# Altium integrated library WCAP-AIG8_rev15a.intlib: 27 symbols
Pins are listed as number, name and electrical type; pins without a type are passive.

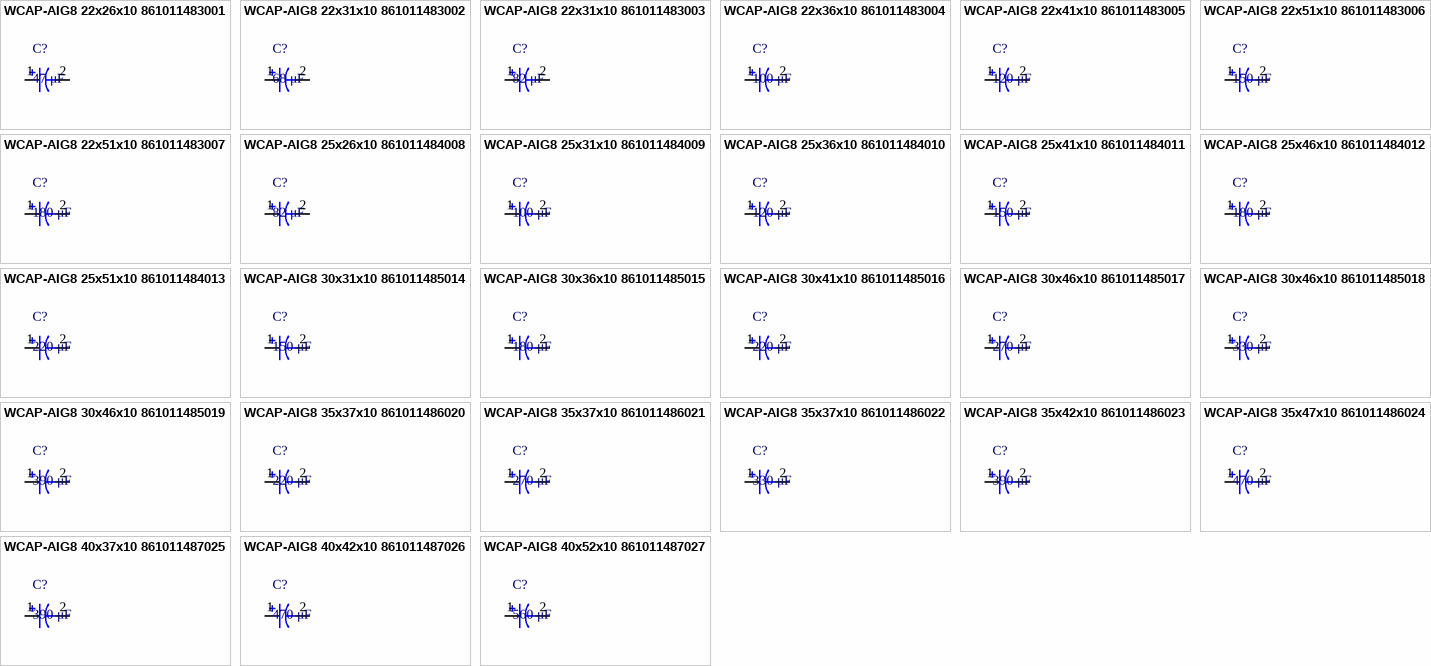
[diagram p0: symbols WCAP-AIG8 22x26x10 861011483001 to WCAP-AIG8 40x52x10 861011487027]

## WCAP-AIG8 22x26x10 861011483001
designator C?, comment 47 μF
WCAP-AIG8 Aluminum Electrolytic Capacitors , 47 μF; + / - 20%; 450 V , 22 x 26; Manufacturer: Wurth Elektronik; partNo: 861011483001; E-mail: libraries@we-online.com; Characteristics: Aluminum Electrolytic Capacitor; Recommended soldering: Wave; Operating temperature: –25 °C to +85 °C; General purpose product series; Load life: 2000 h @ +85 °C; ComponentLink1Description: Manufacturer; ComponentLink1URL: http://www.we-online.com; ComponentLink2Description: Datasheet; ComponentLink2URL: http://katalog.we-online.de/pbs/datasheet/861011483001.pdf; Created by: Karrer Zheng; Created Date: 6/8/2015; Capacitance: 47 μF; Application: Medium and high voltage type range from 160V-450V used as primary side input filter in power supply, which can be used in general switching power supply, PC power supply and industrial computer power supply,server power supply, AC-DC converter, motor drive circuit DC storage filter, digital audio, digital TV, communication base station, DC-AC inverter, inverter power supply and converters etc
footprint WCAP-AIG8 22x26x10
pins: 1, 2

## WCAP-AIG8 22x31x10 861011483002
designator C?, comment 68 μF
WCAP-AIG8 Aluminum Electrolytic Capacitors , 68 μF; + / - 20%; 450 V , 22 x 31; Manufacturer: Wurth Elektronik; partNo: 861011483002; E-mail: libraries@we-online.com; Characteristics: Aluminum Electrolytic Capacitor; Recommended soldering: Wave; Operating temperature: –25 °C to +85 °C; General purpose product series; Load life: 2000 h @ +85 °C; ComponentLink1Description: Manufacturer; ComponentLink1URL: http://www.we-online.com; ComponentLink2Description: Datasheet; ComponentLink2URL: http://katalog.we-online.de/pbs/datasheet/861011483002.pdf; Created by: Karrer Zheng; Created Date: 6/8/2015; Capacitance: 68 μF; Application: Medium and high voltage type range from 160V-450V used as primary side input filter in power supply, which can be used in general switching power supply, PC power supply and industrial computer power supply,server power supply, AC-DC converter, motor drive circuit DC storage filter, digital audio, digital TV, communication base station, DC-AC inverter, inverter power supply and converters etc
footprint WCAP-AIG8 22x31x10
pins: 1, 2

## WCAP-AIG8 22x31x10 861011483003
designator C?, comment 82 μF
WCAP-AIG8 Aluminum Electrolytic Capacitors , 82 μF; + / - 20%; 450 V , 22 x 31; Manufacturer: Wurth Elektronik; partNo: 861011483003; E-mail: libraries@we-online.com; Characteristics: Aluminum Electrolytic Capacitor; Recommended soldering: Wave; Operating temperature: –25 °C to +85 °C; General purpose product series; Load life: 2000 h @ +85 °C; ComponentLink1Description: Manufacturer; ComponentLink1URL: http://www.we-online.com; ComponentLink2Description: Datasheet; ComponentLink2URL: http://katalog.we-online.de/pbs/datasheet/861011483003.pdf; Created by: Karrer Zheng; Created Date: 6/8/2015; Capacitance: 82 μF; Application: Medium and high voltage type range from 160V-450V used as primary side input filter in power supply, which can be used in general switching power supply, PC power supply and industrial computer power supply,server power supply, AC-DC converter, motor drive circuit DC storage filter, digital audio, digital TV, communication base station, DC-AC inverter, inverter power supply and converters etc
footprint WCAP-AIG8 22x31x10
pins: 1, 2

## WCAP-AIG8 22x36x10 861011483004
designator C?, comment 100 μF
WCAP-AIG8 Aluminum Electrolytic Capacitors , 100 μF; + / - 20%; 450 V , 22 x 36; Manufacturer: Wurth Elektronik; partNo: 861011483004; E-mail: libraries@we-online.com; Characteristics: Aluminum Electrolytic Capacitor; Recommended soldering: Wave; Operating temperature: –25 °C to +85 °C; General purpose product series; Load life: 2000 h @ +85 °C; ComponentLink1Description: Manufacturer; ComponentLink1URL: http://www.we-online.com; ComponentLink2Description: Datasheet; ComponentLink2URL: http://katalog.we-online.de/pbs/datasheet/861011483004.pdf; Created by: Karrer Zheng; Created Date: 6/8/2015; Capacitance: 100 μF; Application: Medium and high voltage type range from 160V-450V used as primary side input filter in power supply, which can be used in general switching power supply, PC power supply and industrial computer power supply,server power supply, AC-DC converter, motor drive circuit DC storage filter, digital audio, digital TV, communication base station, DC-AC inverter, inverter power supply and converters etc
footprint WCAP-AIG8 22x36x10
pins: 1, 2

## WCAP-AIG8 22x41x10 861011483005
designator C?, comment 120 μF
WCAP-AIG8 Aluminum Electrolytic Capacitors , 120 μF; + / - 20%; 450 V , 22 x 41; Manufacturer: Wurth Elektronik; partNo: 861011483005; E-mail: libraries@we-online.com; Characteristics: Aluminum Electrolytic Capacitor; Recommended soldering: Wave; Operating temperature: –25 °C to +85 °C; General purpose product series; Load life: 2000 h @ +85 °C; ComponentLink1Description: Manufacturer; ComponentLink1URL: http://www.we-online.com; ComponentLink2Description: Datasheet; ComponentLink2URL: http://katalog.we-online.de/pbs/datasheet/861011483005.pdf; Created by: Karrer Zheng; Created Date: 6/8/2015; Capacitance: 120 μF; Application: Medium and high voltage type range from 160V-450V used as primary side input filter in power supply, which can be used in general switching power supply, PC power supply and industrial computer power supply,server power supply, AC-DC converter, motor drive circuit DC storage filter, digital audio, digital TV, communication base station, DC-AC inverter, inverter power supply and converters etc
footprint WCAP-AIG8 22x41x10
pins: 1, 2

## WCAP-AIG8 22x51x10 861011483006
designator C?, comment 150 μF
WCAP-AIG8 Aluminum Electrolytic Capacitors , 150 μF; + / - 20%; 450 V , 22 x 51; Manufacturer: Wurth Elektronik; partNo: 861011483006; E-mail: libraries@we-online.com; Characteristics: Aluminum Electrolytic Capacitor; Recommended soldering: Wave; Operating temperature: –25 °C to +85 °C; General purpose product series; Load life: 2000 h @ +85 °C; ComponentLink1Description: Manufacturer; ComponentLink1URL: http://www.we-online.com; ComponentLink2Description: Datasheet; ComponentLink2URL: http://katalog.we-online.de/pbs/datasheet/861011483006.pdf; Created by: Karrer Zheng; Created Date: 6/8/2015; Capacitance: 150 μF; Application: Medium and high voltage type range from 160V-450V used as primary side input filter in power supply, which can be used in general switching power supply, PC power supply and industrial computer power supply,server power supply, AC-DC converter, motor drive circuit DC storage filter, digital audio, digital TV, communication base station, DC-AC inverter, inverter power supply and converters etc
footprint WCAP-AIG8 22x51x10
pins: 1, 2

## WCAP-AIG8 22x51x10 861011483007
designator C?, comment 180 μF
WCAP-AIG8 Aluminum Electrolytic Capacitors , 180 μF; + / - 20%; 450 V , 22 x 51; Manufacturer: Wurth Elektronik; partNo: 861011483007; E-mail: libraries@we-online.com; Characteristics: Aluminum Electrolytic Capacitor; Recommended soldering: Wave; Operating temperature: –25 °C to +85 °C; General purpose product series; Load life: 2000 h @ +85 °C; ComponentLink1Description: Manufacturer; ComponentLink1URL: http://www.we-online.com; ComponentLink2Description: Datasheet; ComponentLink2URL: http://katalog.we-online.de/pbs/datasheet/861011483007.pdf; Created by: Karrer Zheng; Created Date: 6/8/2015; Capacitance: 180 μF; Application: Medium and high voltage type range from 160V-450V used as primary side input filter in power supply, which can be used in general switching power supply, PC power supply and industrial computer power supply,server power supply, AC-DC converter, motor drive circuit DC storage filter, digital audio, digital TV, communication base station, DC-AC inverter, inverter power supply and converters etc
footprint WCAP-AIG8 22x51x10
pins: 1, 2

## WCAP-AIG8 25x26x10 861011484008
designator C?, comment 82 μF
WCAP-AIG8 Aluminum Electrolytic Capacitors , 82 μF; + / - 20%; 450 V , 25 x 26; Manufacturer: Wurth Elektronik; partNo: 861011484008; E-mail: libraries@we-online.com; Characteristics: Aluminum Electrolytic Capacitor; Recommended soldering: Wave; Operating temperature: –25 °C to +85 °C; General purpose product series; Load life: 2000 h @ +85 °C; ComponentLink1Description: Manufacturer; ComponentLink1URL: http://www.we-online.com; ComponentLink2Description: Datasheet; ComponentLink2URL: http://katalog.we-online.de/pbs/datasheet/861011484008.pdf; Created by: Karrer Zheng; Created Date: 6/8/2015; Capacitance: 82 μF; Application: Medium and high voltage type range from 160V-450V used as primary side input filter in power supply, which can be used in general switching power supply, PC power supply and industrial computer power supply,server power supply, AC-DC converter, motor drive circuit DC storage filter, digital audio, digital TV, communication base station, DC-AC inverter, inverter power supply and converters etc
footprint WCAP-AIG8 25x26x10
pins: 1, 2

## WCAP-AIG8 25x31x10 861011484009
designator C?, comment 100 μF
WCAP-AIG8 Aluminum Electrolytic Capacitors , 100 μF; + / - 20%; 450 V , 25 x 31; Manufacturer: Wurth Elektronik; partNo: 861011484009; E-mail: libraries@we-online.com; Characteristics: Aluminum Electrolytic Capacitor; Recommended soldering: Wave; Operating temperature: –25 °C to +85 °C; General purpose product series; Load life: 2000 h @ +85 °C; ComponentLink1Description: Manufacturer; ComponentLink1URL: http://www.we-online.com; ComponentLink2Description: Datasheet; ComponentLink2URL: http://katalog.we-online.de/pbs/datasheet/861011484009.pdf; Created by: Karrer Zheng; Created Date: 6/8/2015; Capacitance: 100 μF; Application: Medium and high voltage type range from 160V-450V used as primary side input filter in power supply, which can be used in general switching power supply, PC power supply and industrial computer power supply,server power supply, AC-DC converter, motor drive circuit DC storage filter, digital audio, digital TV, communication base station, DC-AC inverter, inverter power supply and converters etc
footprint WCAP-AIG8 25x31x10
pins: 1, 2

## WCAP-AIG8 25x36x10 861011484010
designator C?, comment 120 μF
WCAP-AIG8 Aluminum Electrolytic Capacitors , 120 μF; + / - 20%; 450 V , 25 x 36; Manufacturer: Wurth Elektronik; partNo: 861011484010; E-mail: libraries@we-online.com; Characteristics: Aluminum Electrolytic Capacitor; Recommended soldering: Wave; Operating temperature: –25 °C to +85 °C; General purpose product series; Load life: 2000 h @ +85 °C; ComponentLink1Description: Manufacturer; ComponentLink1URL: http://www.we-online.com; ComponentLink2Description: Datasheet; ComponentLink2URL: http://katalog.we-online.de/pbs/datasheet/861011484010.pdf; Created by: Karrer Zheng; Created Date: 6/8/2015; Capacitance: 120 μF; Application: Medium and high voltage type range from 160V-450V used as primary side input filter in power supply, which can be used in general switching power supply, PC power supply and industrial computer power supply,server power supply, AC-DC converter, motor drive circuit DC storage filter, digital audio, digital TV, communication base station, DC-AC inverter, inverter power supply and converters etc
footprint WCAP-AIG8 25x36x10
pins: 1, 2

## WCAP-AIG8 25x41x10 861011484011
designator C?, comment 150 μF
WCAP-AIG8 Aluminum Electrolytic Capacitors , 150 μF; + / - 20%; 450 V , 25 x 41; Manufacturer: Wurth Elektronik; partNo: 861011484011; E-mail: libraries@we-online.com; Characteristics: Aluminum Electrolytic Capacitor; Recommended soldering: Wave; Operating temperature: –25 °C to +85 °C; General purpose product series; Load life: 2000 h @ +85 °C; ComponentLink1Description: Manufacturer; ComponentLink1URL: http://www.we-online.com; ComponentLink2Description: Datasheet; ComponentLink2URL: http://katalog.we-online.de/pbs/datasheet/861011484011.pdf; Created by: Karrer Zheng; Created Date: 6/8/2015; Capacitance: 150 μF; Application: Medium and high voltage type range from 160V-450V used as primary side input filter in power supply, which can be used in general switching power supply, PC power supply and industrial computer power supply,server power supply, AC-DC converter, motor drive circuit DC storage filter, digital audio, digital TV, communication base station, DC-AC inverter, inverter power supply and converters etc
footprint WCAP-AIG8 25x41x10
pins: 1, 2

## WCAP-AIG8 25x46x10 861011484012
designator C?, comment 180 μF
WCAP-AIG8 Aluminum Electrolytic Capacitors , 180 μF; + / - 20%; 450 V , 25 x 46; Manufacturer: Wurth Elektronik; partNo: 861011484012; E-mail: libraries@we-online.com; Characteristics: Aluminum Electrolytic Capacitor; Recommended soldering: Wave; Operating temperature: –25 °C to +85 °C; General purpose product series; Load life: 2000 h @ +85 °C; ComponentLink1Description: Manufacturer; ComponentLink1URL: http://www.we-online.com; ComponentLink2Description: Datasheet; ComponentLink2URL: http://katalog.we-online.de/pbs/datasheet/861011484012.pdf; Created by: Karrer Zheng; Created Date: 6/8/2015; Capacitance: 180 μF; Application: Medium and high voltage type range from 160V-450V used as primary side input filter in power supply, which can be used in general switching power supply, PC power supply and industrial computer power supply,server power supply, AC-DC converter, motor drive circuit DC storage filter, digital audio, digital TV, communication base station, DC-AC inverter, inverter power supply and converters etc
footprint WCAP-AIG8 25x46x10
pins: 1, 2

## WCAP-AIG8 25x51x10 861011484013
designator C?, comment 220 μF
WCAP-AIG8 Aluminum Electrolytic Capacitors , 220 μF; + / - 20%; 450 V , 25 x 51; Manufacturer: Wurth Elektronik; partNo: 861011484013; E-mail: libraries@we-online.com; Characteristics: Aluminum Electrolytic Capacitor; Recommended soldering: Wave; Operating temperature: –25 °C to +85 °C; General purpose product series; Load life: 2000 h @ +85 °C; ComponentLink1Description: Manufacturer; ComponentLink1URL: http://www.we-online.com; ComponentLink2Description: Datasheet; ComponentLink2URL: http://katalog.we-online.de/pbs/datasheet/861011484013.pdf; Created by: Karrer Zheng; Created Date: 6/8/2015; Capacitance: 220 μF; Application: Medium and high voltage type range from 160V-450V used as primary side input filter in power supply, which can be used in general switching power supply, PC power supply and industrial computer power supply,server power supply, AC-DC converter, motor drive circuit DC storage filter, digital audio, digital TV, communication base station, DC-AC inverter, inverter power supply and converters etc
footprint WCAP-AIG8 25x51x10
pins: 1, 2

## WCAP-AIG8 30x31x10 861011485014
designator C?, comment 150 μF
WCAP-AIG8 Aluminum Electrolytic Capacitors , 150 μF; + / - 20%; 450 V , 30 x 31; Manufacturer: Wurth Elektronik; partNo: 861011485014; E-mail: libraries@we-online.com; Characteristics: Aluminum Electrolytic Capacitor; Recommended soldering: Wave; Operating temperature: –25 °C to +85 °C; General purpose product series; Load life: 2000 h @ +85 °C; ComponentLink1Description: Manufacturer; ComponentLink1URL: http://www.we-online.com; ComponentLink2Description: Datasheet; ComponentLink2URL: http://katalog.we-online.de/pbs/datasheet/861011485014.pdf; Created by: Karrer Zheng; Created Date: 6/8/2015; Capacitance: 150 μF; Application: Medium and high voltage type range from 160V-450V used as primary side input filter in power supply, which can be used in general switching power supply, PC power supply and industrial computer power supply,server power supply, AC-DC converter, motor drive circuit DC storage filter, digital audio, digital TV, communication base station, DC-AC inverter, inverter power supply and converters etc
footprint WCAP-AIG8 30x31x10
pins: 1, 2

## WCAP-AIG8 30x36x10 861011485015
designator C?, comment 180 μF
WCAP-AIG8 Aluminum Electrolytic Capacitors , 180 μF; + / - 20%; 450 V , 30 x 36; Manufacturer: Wurth Elektronik; partNo: 861011485015; E-mail: libraries@we-online.com; Characteristics: Aluminum Electrolytic Capacitor; Recommended soldering: Wave; Operating temperature: –25 °C to +85 °C; General purpose product series; Load life: 2000 h @ +85 °C; ComponentLink1Description: Manufacturer; ComponentLink1URL: http://www.we-online.com; ComponentLink2Description: Datasheet; ComponentLink2URL: http://katalog.we-online.de/pbs/datasheet/861011485015.pdf; Created by: Karrer Zheng; Created Date: 6/8/2015; Capacitance: 180 μF; Application: Medium and high voltage type range from 160V-450V used as primary side input filter in power supply, which can be used in general switching power supply, PC power supply and industrial computer power supply,server power supply, AC-DC converter, motor drive circuit DC storage filter, digital audio, digital TV, communication base station, DC-AC inverter, inverter power supply and converters etc
footprint WCAP-AIG8 30x36x10
pins: 1, 2

## WCAP-AIG8 30x41x10 861011485016
designator C?, comment 220 μF
WCAP-AIG8 Aluminum Electrolytic Capacitors , 220 μF; + / - 20%; 450 V , 30 x 41; Manufacturer: Wurth Elektronik; partNo: 861011485016; E-mail: libraries@we-online.com; Characteristics: Aluminum Electrolytic Capacitor; Recommended soldering: Wave; Operating temperature: –25 °C to +85 °C; General purpose product series; Load life: 2000 h @ +85 °C; ComponentLink1Description: Manufacturer; ComponentLink1URL: http://www.we-online.com; ComponentLink2Description: Datasheet; ComponentLink2URL: http://katalog.we-online.de/pbs/datasheet/861011485016.pdf; Created by: Karrer Zheng; Created Date: 6/8/2015; Capacitance: 220 μF; Application: Medium and high voltage type range from 160V-450V used as primary side input filter in power supply, which can be used in general switching power supply, PC power supply and industrial computer power supply,server power supply, AC-DC converter, motor drive circuit DC storage filter, digital audio, digital TV, communication base station, DC-AC inverter, inverter power supply and converters etc
footprint WCAP-AIG8 30x41x10
pins: 1, 2

## WCAP-AIG8 30x46x10 861011485017
designator C?, comment 270 μF
WCAP-AIG8 Aluminum Electrolytic Capacitors , 270 μF; + / - 20%; 450 V , 30 x 46; Manufacturer: Wurth Elektronik; partNo: 861011485017; E-mail: libraries@we-online.com; Characteristics: Aluminum Electrolytic Capacitor; Recommended soldering: Wave; Operating temperature: –25 °C to +85 °C; General purpose product series; Load life: 2000 h @ +85 °C; ComponentLink1Description: Manufacturer; ComponentLink1URL: http://www.we-online.com; ComponentLink2Description: Datasheet; ComponentLink2URL: http://katalog.we-online.de/pbs/datasheet/861011485017.pdf; Created by: Karrer Zheng; Created Date: 6/8/2015; Capacitance: 270 μF; Application: Medium and high voltage type range from 160V-450V used as primary side input filter in power supply, which can be used in general switching power supply, PC power supply and industrial computer power supply,server power supply, AC-DC converter, motor drive circuit DC storage filter, digital audio, digital TV, communication base station, DC-AC inverter, inverter power supply and converters etc
footprint WCAP-AIG8 30x46x10
pins: 1, 2

## WCAP-AIG8 30x46x10 861011485018
designator C?, comment 330 μF
WCAP-AIG8 Aluminum Electrolytic Capacitors , 330 μF; + / - 20%; 450 V , 30 x 46; Manufacturer: Wurth Elektronik; partNo: 861011485018; E-mail: libraries@we-online.com; Characteristics: Aluminum Electrolytic Capacitor; Recommended soldering: Wave; Operating temperature: –25 °C to +85 °C; General purpose product series; Load life: 2000 h @ +85 °C; ComponentLink1Description: Manufacturer; ComponentLink1URL: http://www.we-online.com; ComponentLink2Description: Datasheet; ComponentLink2URL: http://katalog.we-online.de/pbs/datasheet/861011485018.pdf; Created by: Karrer Zheng; Created Date: 6/8/2015; Capacitance: 330 μF; Application: Medium and high voltage type range from 160V-450V used as primary side input filter in power supply, which can be used in general switching power supply, PC power supply and industrial computer power supply,server power supply, AC-DC converter, motor drive circuit DC storage filter, digital audio, digital TV, communication base station, DC-AC inverter, inverter power supply and converters etc
footprint WCAP-AIG8 30x46x10
pins: 1, 2

## WCAP-AIG8 30x46x10 861011485019
designator C?, comment 390 μF
WCAP-AIG8 Aluminum Electrolytic Capacitors , 390 μF; + / - 20%; 450 V , 30 x 46; Manufacturer: Wurth Elektronik; partNo: 861011485019; E-mail: libraries@we-online.com; Characteristics: Aluminum Electrolytic Capacitor; Recommended soldering: Wave; Operating temperature: –25 °C to +85 °C; General purpose product series; Load life: 2000 h @ +85 °C; ComponentLink1Description: Manufacturer; ComponentLink1URL: http://www.we-online.com; ComponentLink2Description: Datasheet; ComponentLink2URL: http://katalog.we-online.de/pbs/datasheet/861011485019.pdf; Created by: Karrer Zheng; Created Date: 6/8/2015; Capacitance: 390 μF; Application: Medium and high voltage type range from 160V-450V used as primary side input filter in power supply, which can be used in general switching power supply, PC power supply and industrial computer power supply,server power supply, AC-DC converter, motor drive circuit DC storage filter, digital audio, digital TV, communication base station, DC-AC inverter, inverter power supply and converters etc
footprint WCAP-AIG8 30x46x10
pins: 1, 2

## WCAP-AIG8 35x37x10 861011486020
designator C?, comment 220 μF
WCAP-AIG8 Aluminum Electrolytic Capacitors , 220 μF; + / - 20%; 450 V , 35 x 37; Manufacturer: Wurth Elektronik; partNo: 861011486020; E-mail: libraries@we-online.com; Characteristics: Aluminum Electrolytic Capacitor; Recommended soldering: Wave; Operating temperature: –25 °C to +85 °C; General purpose product series; Load life: 2000 h @ +85 °C; ComponentLink1Description: Manufacturer; ComponentLink1URL: http://www.we-online.com; ComponentLink2Description: Datasheet; ComponentLink2URL: http://katalog.we-online.de/pbs/datasheet/861011486020.pdf; Created by: Karrer Zheng; Created Date: 6/8/2015; Capacitance: 220 μF; Application: Medium and high voltage type range from 160V-450V used as primary side input filter in power supply, which can be used in general switching power supply, PC power supply and industrial computer power supply,server power supply, AC-DC converter, motor drive circuit DC storage filter, digital audio, digital TV, communication base station, DC-AC inverter, inverter power supply and converters etc
footprint WCAP-AIG8 35x37x10
pins: 1, 2

## WCAP-AIG8 35x37x10 861011486021
designator C?, comment 270 μF
WCAP-AIG8 Aluminum Electrolytic Capacitors , 270 μF; + / - 20%; 450 V , 35 x 37; Manufacturer: Wurth Elektronik; partNo: 861011486021; E-mail: libraries@we-online.com; Characteristics: Aluminum Electrolytic Capacitor; Recommended soldering: Wave; Operating temperature: –25 °C to +85 °C; General purpose product series; Load life: 2000 h @ +85 °C; ComponentLink1Description: Manufacturer; ComponentLink1URL: http://www.we-online.com; ComponentLink2Description: Datasheet; ComponentLink2URL: http://katalog.we-online.de/pbs/datasheet/861011486021.pdf; Created by: Karrer Zheng; Created Date: 6/8/2015; Capacitance: 270 μF; Application: Medium and high voltage type range from 160V-450V used as primary side input filter in power supply, which can be used in general switching power supply, PC power supply and industrial computer power supply,server power supply, AC-DC converter, motor drive circuit DC storage filter, digital audio, digital TV, communication base station, DC-AC inverter, inverter power supply and converters etc
footprint WCAP-AIG8 35x37x10
pins: 1, 2

## WCAP-AIG8 35x37x10 861011486022
designator C?, comment 330 μF
WCAP-AIG8 Aluminum Electrolytic Capacitors , 330 μF; + / - 20%; 450 V , 35 x 37; Manufacturer: Wurth Elektronik; partNo: 861011486022; E-mail: libraries@we-online.com; Characteristics: Aluminum Electrolytic Capacitor; Recommended soldering: Wave; Operating temperature: –25 °C to +85 °C; General purpose product series; Load life: 2000 h @ +85 °C; ComponentLink1Description: Manufacturer; ComponentLink1URL: http://www.we-online.com; ComponentLink2Description: Datasheet; ComponentLink2URL: http://katalog.we-online.de/pbs/datasheet/861011486022.pdf; Created by: Karrer Zheng; Created Date: 6/8/2015; Capacitance: 330 μF; Application: Medium and high voltage type range from 160V-450V used as primary side input filter in power supply, which can be used in general switching power supply, PC power supply and industrial computer power supply,server power supply, AC-DC converter, motor drive circuit DC storage filter, digital audio, digital TV, communication base station, DC-AC inverter, inverter power supply and converters etc
footprint WCAP-AIG8 35x37x10
pins: 1, 2

## WCAP-AIG8 35x42x10 861011486023
designator C?, comment 390 μF
WCAP-AIG8 Aluminum Electrolytic Capacitors , 390 μF; + / - 20%; 450 V , 35 x 42; Manufacturer: Wurth Elektronik; partNo: 861011486023; E-mail: libraries@we-online.com; Characteristics: Aluminum Electrolytic Capacitor; Recommended soldering: Wave; Operating temperature: –25 °C to +85 °C; General purpose product series; Load life: 2000 h @ +85 °C; ComponentLink1Description: Manufacturer; ComponentLink1URL: http://www.we-online.com; ComponentLink2Description: Datasheet; ComponentLink2URL: http://katalog.we-online.de/pbs/datasheet/861011486023.pdf; Created by: Karrer Zheng; Created Date: 6/8/2015; Capacitance: 390 μF; Application: Medium and high voltage type range from 160V-450V used as primary side input filter in power supply, which can be used in general switching power supply, PC power supply and industrial computer power supply,server power supply, AC-DC converter, motor drive circuit DC storage filter, digital audio, digital TV, communication base station, DC-AC inverter, inverter power supply and converters etc
footprint WCAP-AIG8 35x42x10
pins: 1, 2

## WCAP-AIG8 35x47x10 861011486024
designator C?, comment 470 μF
WCAP-AIG8 Aluminum Electrolytic Capacitors , 470 μF; + / - 20%; 450 V , 35 x 47; Manufacturer: Wurth Elektronik; partNo: 861011486024; E-mail: libraries@we-online.com; Characteristics: Aluminum Electrolytic Capacitor; Recommended soldering: Wave; Operating temperature: –25 °C to +85 °C; General purpose product series; Load life: 2000 h @ +85 °C; ComponentLink1Description: Manufacturer; ComponentLink1URL: http://www.we-online.com; ComponentLink2Description: Datasheet; ComponentLink2URL: http://katalog.we-online.de/pbs/datasheet/861011486024.pdf; Created by: Karrer Zheng; Created Date: 6/8/2015; Capacitance: 470 μF; Application: Medium and high voltage type range from 160V-450V used as primary side input filter in power supply, which can be used in general switching power supply, PC power supply and industrial computer power supply,server power supply, AC-DC converter, motor drive circuit DC storage filter, digital audio, digital TV, communication base station, DC-AC inverter, inverter power supply and converters etc
footprint WCAP-AIG8 35x47x10
pins: 1, 2

## WCAP-AIG8 40x37x10 861011487025
designator C?, comment 390 μF
WCAP-AIG8 Aluminum Electrolytic Capacitors , 390 μF; + / - 20%; 450 V , 40 x 37; Manufacturer: Wurth Elektronik; partNo: 861011487025; E-mail: libraries@we-online.com; Characteristics: Aluminum Electrolytic Capacitor; Recommended soldering: Wave; Operating temperature: –25 °C to +85 °C; General purpose product series; Load life: 2000 h @ +85 °C; ComponentLink1Description: Manufacturer; ComponentLink1URL: http://www.we-online.com; ComponentLink2Description: Datasheet; ComponentLink2URL: http://katalog.we-online.de/pbs/datasheet/861011487025.pdf; Created by: Karrer Zheng; Created Date: 6/8/2015; Capacitance: 390 μF; Application: Medium and high voltage type range from 160V-450V used as primary side input filter in power supply, which can be used in general switching power supply, PC power supply and industrial computer power supply,server power supply, AC-DC converter, motor drive circuit DC storage filter, digital audio, digital TV, communication base station, DC-AC inverter, inverter power supply and converters etc
footprint WCAP-AIG8 40x37x10
pins: 1, 2

## WCAP-AIG8 40x42x10 861011487026
designator C?, comment 470 μF
WCAP-AIG8 Aluminum Electrolytic Capacitors , 470 μF; + / - 20%; 450 V , 40 x 42; Manufacturer: Wurth Elektronik; partNo: 861011487026; E-mail: libraries@we-online.com; Characteristics: Aluminum Electrolytic Capacitor; Recommended soldering: Wave; Operating temperature: –25 °C to +85 °C; General purpose product series; Load life: 2000 h @ +85 °C; ComponentLink1Description: Manufacturer; ComponentLink1URL: http://www.we-online.com; ComponentLink2Description: Datasheet; ComponentLink2URL: http://katalog.we-online.de/pbs/datasheet/861011487026.pdf; Created by: Karrer Zheng; Created Date: 6/8/2015; Capacitance: 470 μF; Application: Medium and high voltage type range from 160V-450V used as primary side input filter in power supply, which can be used in general switching power supply, PC power supply and industrial computer power supply,server power supply, AC-DC converter, motor drive circuit DC storage filter, digital audio, digital TV, communication base station, DC-AC inverter, inverter power supply and converters etc
footprint WCAP-AIG8 40x42x10
pins: 1, 2

## WCAP-AIG8 40x52x10 861011487027
designator C?, comment 560 μF
WCAP-AIG8 Aluminum Electrolytic Capacitors , 560 μF; + / - 20%; 450 V , 40 x 52; Manufacturer: Wurth Elektronik; partNo: 861011487027; E-mail: libraries@we-online.com; Characteristics: Aluminum Electrolytic Capacitor; Recommended soldering: Wave; Operating temperature: –25 °C to +85 °C; General purpose product series; Load life: 2000 h @ +85 °C; ComponentLink1Description: Manufacturer; ComponentLink1URL: http://www.we-online.com; ComponentLink2Description: Datasheet; ComponentLink2URL: http://katalog.we-online.de/pbs/datasheet/861011487027.pdf; Created by: Karrer Zheng; Created Date: 6/8/2015; Capacitance: 560 μF; Application: Medium and high voltage type range from 160V-450V used as primary side input filter in power supply, which can be used in general switching power supply, PC power supply and industrial computer power supply,server power supply, AC-DC converter, motor drive circuit DC storage filter, digital audio, digital TV, communication base station, DC-AC inverter, inverter power supply and converters etc
footprint WCAP-AIG8 40x52x10
pins: 1, 2